# Altium footprint library Amirreza.PcbLib: 524 footprints (part 30 of 33)
Each footprint in its own frame and in the unit in brackets; x right, y up, seen from the top. Pads: shape width x height; smd on the part's side, far side on the other; paste and mask are expansions set on the pad; w line width, h text height; cw(c..) or ccw(c..) is an arc to the next point about the centre after c.
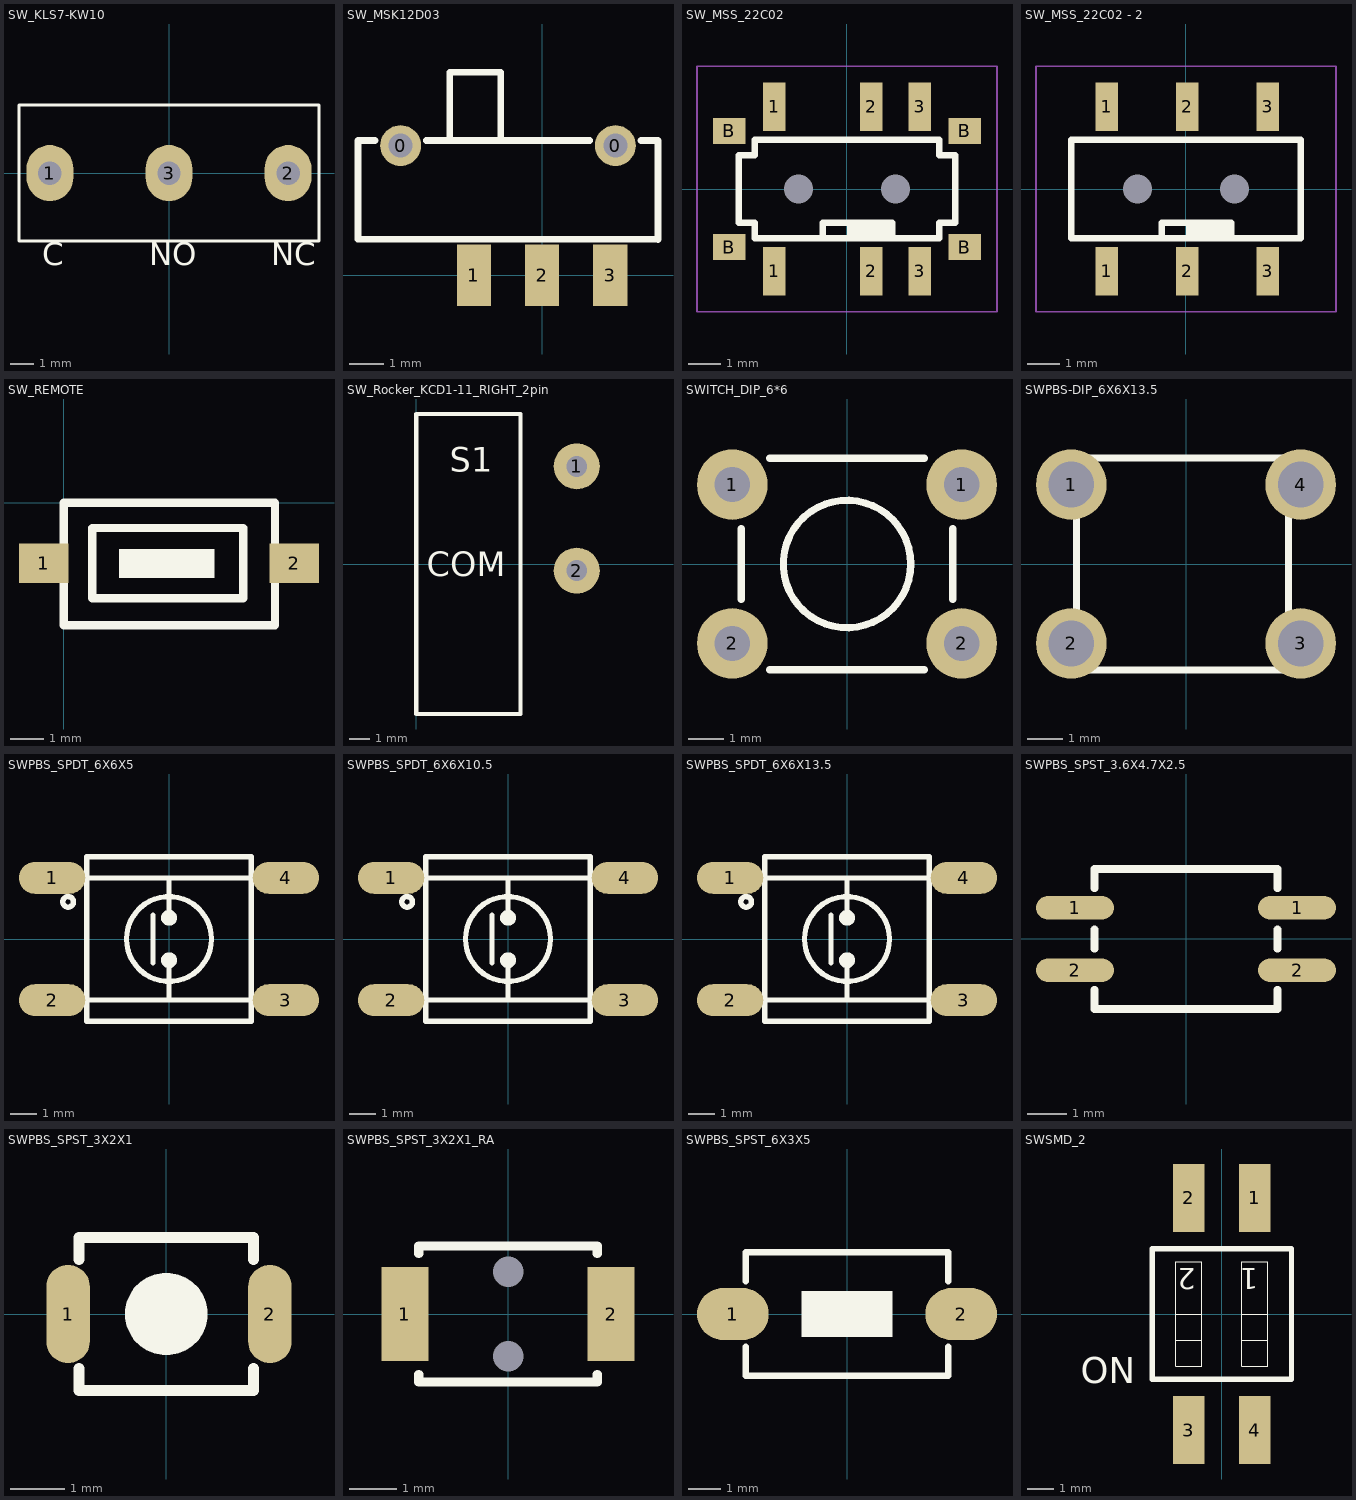
[diagram p29: the footprints below, top view; thin cyan lines are the x and y axes]

## SW_KLS7-KW10 [mm]
pads (3):
  oval 2x2.4 hole 1: 1(-5.08,0) 2(5.08,0) 3(0,0)
Top Overlay:
  lines w0.127: -6.4,-2.9 6.4,-2.9 6.4,2.9 -6.4,2.9 -6.4,-2.9
  text "NC" at 4.366,-4.253 h1.65
  text "NO" at -0.841,-4.255 h1.65
  text "C" at -5.413,-4.253 h1.65
3D body "d2f-01fl.stp": height 11.52, standoff -3.48, extent -6.4,-2.9 6.734,2.9

## SW_MSK12D03 [mm] "SLIDE SWITCH_MSK12D03-TG2-NS-01"
pads (5):
  round 1.2 / inner round 1.2 / far side round 1.4 hole 0.7: 0(-4.15,3.8) 0(2.15,3.8)
  rect 1x1.8 smd: 1(-2,0) 2(0,0) 3(2,0)
Top Overlay:
  lines w0.2: -4.9,3.95 -5.4,3.95 -5.4,1.05 3.4,1.047 ; -3.4,3.95 1.4,3.95 ; -2.711,3.95 -2.711,5.95 -1.211,5.95 -1.211,3.95 ; 2.9,3.95 3.4,3.95 3.4,1.05

## SW_MSS_22C02 [mm]
pads (12):
  round 0 hole 0.9: 0(-1.5,0) 0(1.5,0)
  rect 0.7x1.5 smd: 1(-2.25,-2.55) 1(-2.25,2.55) 2(0.75,-2.55) 2(0.75,2.55) 3(2.25,-2.55) 3(2.25,2.55)
  rect 1x0.8 smd: B(-3.65,-1.8) B(-3.65,1.8) B(3.65,-1.8) B(3.65,1.8)
Top Overlay:
  rectangle: 0.1,-1.527 1.4,-1.05
  lines w0.203: -2.861,-1.287 -2.861,-1.527 ; -2.861,1.287 -2.861,1.527 ; -1.586,-1.527 -2.861,-1.527 ; -1.586,1.527 -2.861,1.527 ; -0.75,-1.527 -0.75,-1.05 1.4,-1.05 1.4,-1.527 ; 0.1,-1.527 0.1,-1.05 ; -2.861,-1.527 2.861,-1.527 2.861,-1.047 3.35,-1.047 3.35,0 3.35,1.047 2.861,1.047 2.861,1.527 -2.861,1.527 ; -2.861,-1.527 -2.861,-1.047 -3.35,-1.047 -3.35,0 -3.35,1.047 -2.861,1.047 -2.861,1.527
Mechanical 13:
  lines w0.05: -4.65,-3.8 4.65,-3.8 4.65,3.8 -4.65,3.8 -4.65,-3.8
3D body "ss-3390s-l2.stp": height 3.5, standoff -0.5, extent -3.6,-3 3.6,3

## SW_MSS_22C02 - 2 [mm]
pads (8):
  round 0 hole 0.9: 0(-1.5,0) 0(1.5,0)
  rect 0.7x1.5 smd: 1(-2.46,-2.55) 1(-2.46,2.55) 2(0.04,-2.55) 2(0.04,2.55) 3(2.54,-2.55) 3(2.54,2.55)
Top Overlay:
  rectangle: 0.1,-1.527 1.4,-1.05
  lines w0.203: -3.545,1.527 -1.586,1.527 ; -1.586,-1.527 -2.861,-1.527 ; -0.75,-1.527 -0.75,-1.05 1.4,-1.05 1.4,-1.527 ; 0.1,-1.527 0.1,-1.05 ; -2.861,-1.527 2.861,-1.527 3.56,-1.527 3.56,0 3.56,1.047 3.56,1.527 -3.56,1.527 -3.56,1.047 -3.56,0 -3.56,-1.527 -2.861,-1.527
Mechanical 13:
  lines w0.05: -4.65,-3.8 4.65,-3.8 4.65,3.8 -4.65,3.8 -4.65,-3.8
3D body "ss-3390s-l2.stp": height 3.5, standoff -0.5, extent -3.6,-3 3.6,3

## SW_REMOTE [mm]
pads (2):
  rect 1.5x1.2 smd: 1(-0.61,-1.829) 2(6.985,-1.829)
Top Overlay:
  rectangle: 1.676,-2.286 4.572,-1.397
  lines w0.254: 0,-3.708 0,0 6.401,0 6.401,-3.708 0,-3.708 ; 0.864,-2.896 0.864,-0.762 5.436,-0.762 5.436,-2.896 0.864,-2.896

## SW_Rocker_KCD1-11_RIGHT_2pin [mm]
pads (2):
  round 2.2 hole 1: 1(7.667,4.665) 2(7.667,-0.315)
Top Overlay:
  lines w0.2: 0,-7.165 4.974,-7.165 4.974,7.165 0,7.165 0,-7.165
  text "COM" at 0.511,-0.956 h2
  text "S1" at 1.597,4.024 h2
3D body "1x1 TH Vert 100mil.step": height 8.38, standoff -3.3, extent 6.397,-1.585 8.937,0.955
3D body "1x1 TH Vert 100mil.step": height 8.38, standoff -3.3, extent 6.397,3.395 8.937,5.935
3D body "Rocker Switch_KCD1-11_2pin.stp": height 11.25, standoff 0.75, extent -7.706,-7.75 11.967,7.75

## SWITCH_DIP_6*6 [mm]
pads (4):
  round 2 hole 1: 1(-3.25,2.25) 1(3.25,2.25) 2(-3.25,-2.25) 2(3.25,-2.25)
Top Overlay:
  circle w0.203: c0,0 r1.806
  lines w0.203: -2.995,-1 -2.995,1 ; -2.2,-2.995 2.2,-2.995 ; -2.2,2.995 2.2,2.995 ; 2.995,-1 2.995,1
3D body "19926.stp": height 4.3, standoff -3.5, extent -3.85,-3 3.85,3

## SWPBS-DIP_6X6X13.5 [mm]
pads (4):
  round 2 hole 1.3: 1(-3.25,2.25) 2(-3.25,-2.25) 3(3.25,-2.25) 4(3.25,2.25)
Top Overlay:
  lines w0.2: -3.1,-3 2.9,-3 2.9,3 -3.1,3 -3.1,-3
Bottom Overlay:
  circle w0.254: c0,0 r1.75
3D body "Tactal Switch -Thru (6mmx 6mmx15.0mm).stp": height 15, standoff -3.18, extent -4.286,-2.997 4.086,2.998

## SWPBS_SPDT_6X6X5 [mm] "SWITCH, PUSHBUTTON, SMD, SPDT, 6X6mm 4PIN"
height 5
pads (4):
  oval 2.5x1.2 smd mask+0.1: 1(-4.4,2.3) 2(-4.4,-2.3) 3(4.4,-2.3) 4(4.4,2.3)
Top Overlay:
  circle w0.2: c0,-0.8 r0.2
  circle w0.2: c0,0.8 r0.2
  circle w0.2: c0,0 r1.6
  circle w0.2: c-3.8,1.4 r0.2
  lines w0.2: -3.1,-2.3 3,-2.3 ; -3.1,2.3 3,2.3 ; -0.6,-0.9 -0.6,0.9 ; 0,-2.3 0,-0.8 ; 0,0.8 0,2.3 ; -3.1,-3.1 -3.1,3.1 3.1,3.1 3.1,-3.1 -3.1,-3.1
3D body "User Library-FSM4JSMATR - TE Connectivity - SPST 6mm Tactile Switch.step": height 5.07, standoff 0.1, extent -5,-3 5,3

## SWPBS_SPDT_6X6X10.5 [mm] "SWITCH, PUSHBUTTON, SMD, SPDT, 6X6mm 4PIN"
height 5
pads (4):
  oval 2.5x1.2 smd mask+0.1: 1(-4.4,2.3) 2(-4.4,-2.3) 3(4.4,-2.3) 4(4.4,2.3)
Top Overlay:
  circle w0.2: c0,-0.8 r0.2
  circle w0.2: c0,0.8 r0.2
  circle w0.2: c0,0 r1.6
  circle w0.2: c-3.8,1.4 r0.2
  lines w0.2: -3.1,-2.3 3,-2.3 ; -3.1,2.3 3,2.3 ; -0.6,-0.9 -0.6,0.9 ; 0,-2.3 0,-0.8 ; 0,0.8 0,2.3 ; -3.1,-3.1 -3.1,3.1 3.1,3.1 3.1,-3.1 -3.1,-3.1
3D body "ts-1102sd-c-n-b.stp": height 10.5, standoff 0, extent -4.6,-3 4.6,3

## SWPBS_SPDT_6X6X13.5 [mm] "SWITCH, PUSHBUTTON, SMD, SPDT, 6X6mm 4PIN"
height 5
pads (4):
  oval 2.5x1.2 smd mask+0.1: 1(-4.4,2.3) 2(-4.4,-2.3) 3(4.4,-2.3) 4(4.4,2.3)
Top Overlay:
  circle w0.2: c0,-0.8 r0.2
  circle w0.2: c0,0.8 r0.2
  circle w0.2: c0,0 r1.6
  circle w0.2: c-3.8,1.4 r0.2
  lines w0.2: -3.1,-2.3 3,-2.3 ; -3.1,2.3 3,2.3 ; -0.6,-0.9 -0.6,0.9 ; 0,-2.3 0,-0.8 ; 0,0.8 0,2.3 ; -3.1,-3.1 -3.1,3.1 3.1,3.1 3.1,-3.1 -3.1,-3.1
3D body "ts-1102sd-b-t-b.stp": height 13.5, standoff 0, extent -4.6,-3 4.6,3

## SWPBS_SPST_3.6X4.7X2.5 [mm] "SWITCH, PUSHBUTTON, SMD, SPST, 3X4X2.5mm"
height 1.2
pads (4):
  oval 2x0.6 smd mask+0.1: 1(-2.85,0.8) 1(2.85,0.8) 2(-2.85,-0.8) 2(2.85,-0.8)
Top Overlay:
  lines w0.2: -2.35,-1.3 -2.35,-1.8 2.35,-1.8 2.35,-1.3 ; -2.35,-0.253 -2.35,0.247 ; -2.35,1.3 -2.35,1.8 2.35,1.8 2.35,1.3 ; 2.35,-0.253 2.35,0.247
3D body "User Library-OMRON B3U1000P.STEP": height 1.6, standoff 0, extent -2,-1.25 2,1.25

## SWPBS_SPST_3X2X1 [mm] "SWITCH, PUSHBUTTON, SMD, SPST, 3X2.5mm"
height 1.2
pads (2):
  oval 0.8x1.8 smd mask+0.1: 1(-1.8,0) 2(1.9,0)
Top Overlay:
  region: -0.75,0 -0.75,0.074 -0.721,0.219 -0.665,0.355 -0.583,0.478 -0.478,0.583 -0.355,0.665 -0.219,0.721 -0.074,0.75 0,0.75 0.074,0.75 0.219,0.721 0.355,0.665 0.478,0.583 0.583,0.478 0.665,0.355 0.721,0.219 0.75,0.074 0.75,0 0.75,-0.074 0.721,-0.219 0.665,-0.355 0.583,-0.478 0.478,-0.583 0.355,-0.665 0.219,-0.721 0.074,-0.75 0,-0.75 -0.074,-0.75 -0.219,-0.721 -0.355,-0.665 -0.478,-0.583 -0.583,-0.478 -0.665,-0.355 -0.721,-0.219 -0.75,-0.074
  lines w0.2: -1.6,-1 -1.6,-1.4 1.6,-1.4 1.6,-1 ; -1.6,1 -1.6,1.4 1.6,1.4 1.6,1
3D body "User Library-OMRON B3U1000P.STEP": height 1.6, standoff 0, extent -2,-1.25 2,1.25

## SWPBS_SPST_3X2X1_RA [mm] "SWITCH, PUSHBUTTON, SMD, SPST, 3X2.5mm"
height 1.2
pads (4):
  round 0 hole 0.65 unplated: 0(0,-0.9) 0(0,0.9)
  rect 1x2 smd mask+0.1: 1(-2.201,0) 2(2.199,0)
Top Overlay:
  lines w0.2: -1.905,-1.292 -1.905,-1.45 1.903,-1.45 1.903,-1.292 ; -1.905,1.292 -1.905,1.45 1.903,1.45 1.903,1.292
3D body "xb-ts-7346-se.stp": height 1.45, standoff -0.55, extent -2.4,-1.45 2.4,2.1

## SWPBS_SPST_6X3X5 [mm] "SWITCH, PUSHBUTTON, SMD, SPST, 6X3.5mm, SKQMBBE010, 50000 Cycles, 1.57N Force"
height 5
pads (2):
  oval 2.2x1.6 smd mask+0.1: 1(-3.5,0) 2(3.5,0)
Top Overlay:
  region: 1.4,0.7 -1.4,0.7 -1.4,-0.7 1.4,-0.7
  lines w0.2: -3.1,-1 -3.1,-1.9 3.1,-1.9 3.1,-1 ; -3.1,1 -3.1,1.9 3.1,1.9 3.1,1
3D body "43685.stp": height 5, standoff 0, extent -3.649,-1.75 3.65,1.75

## SWSMD_2 [mm]
pads (4):
  rect 1.2x2.6 smd: 1(1.27,4.45) 2(-1.27,4.45) 3(-1.27,-4.45) 4(1.27,-4.45)
Top Overlay:
  lines w0.025: -1.77,-1 -0.77,-1 ; -1.77,0 -0.77,0 ; 0.77,-1 1.77,-1 ; 0.77,0 1.77,0 ; -1.77,-2 -0.77,-2 -0.77,2 -1.77,2 -1.77,-2 ; 0.77,-2 1.77,-2 1.77,2 0.77,2 0.77,-2
  lines w0.2: -2.667,-2.5 2.67,-2.5 2.67,2.5 -2.667,2.5 -2.667,-2.5
  text "ON" at -5.41,-2.662 h1
  text "1" at 1.395,1.755 h0.8
  text "2" at -0.991,1.758 h0.8
3D body "User Library-DIP-Schalter SMD 2polig RM2,54.step": height 4.22, standoff 0.02, extent -2.54,-3.861 2.54,3.759